# Altium footprint library Connectors.PcbLib: 408 footprints (part 3 of 26)
Each footprint in its own frame and in the unit in brackets; x right, y up, seen from the top. Pads: shape width x height; smd on the part's side, far side on the other; paste and mask are expansions set on the pad; w line width, h text height; cw(c..) or ccw(c..) is an arc to the next point about the centre after c.
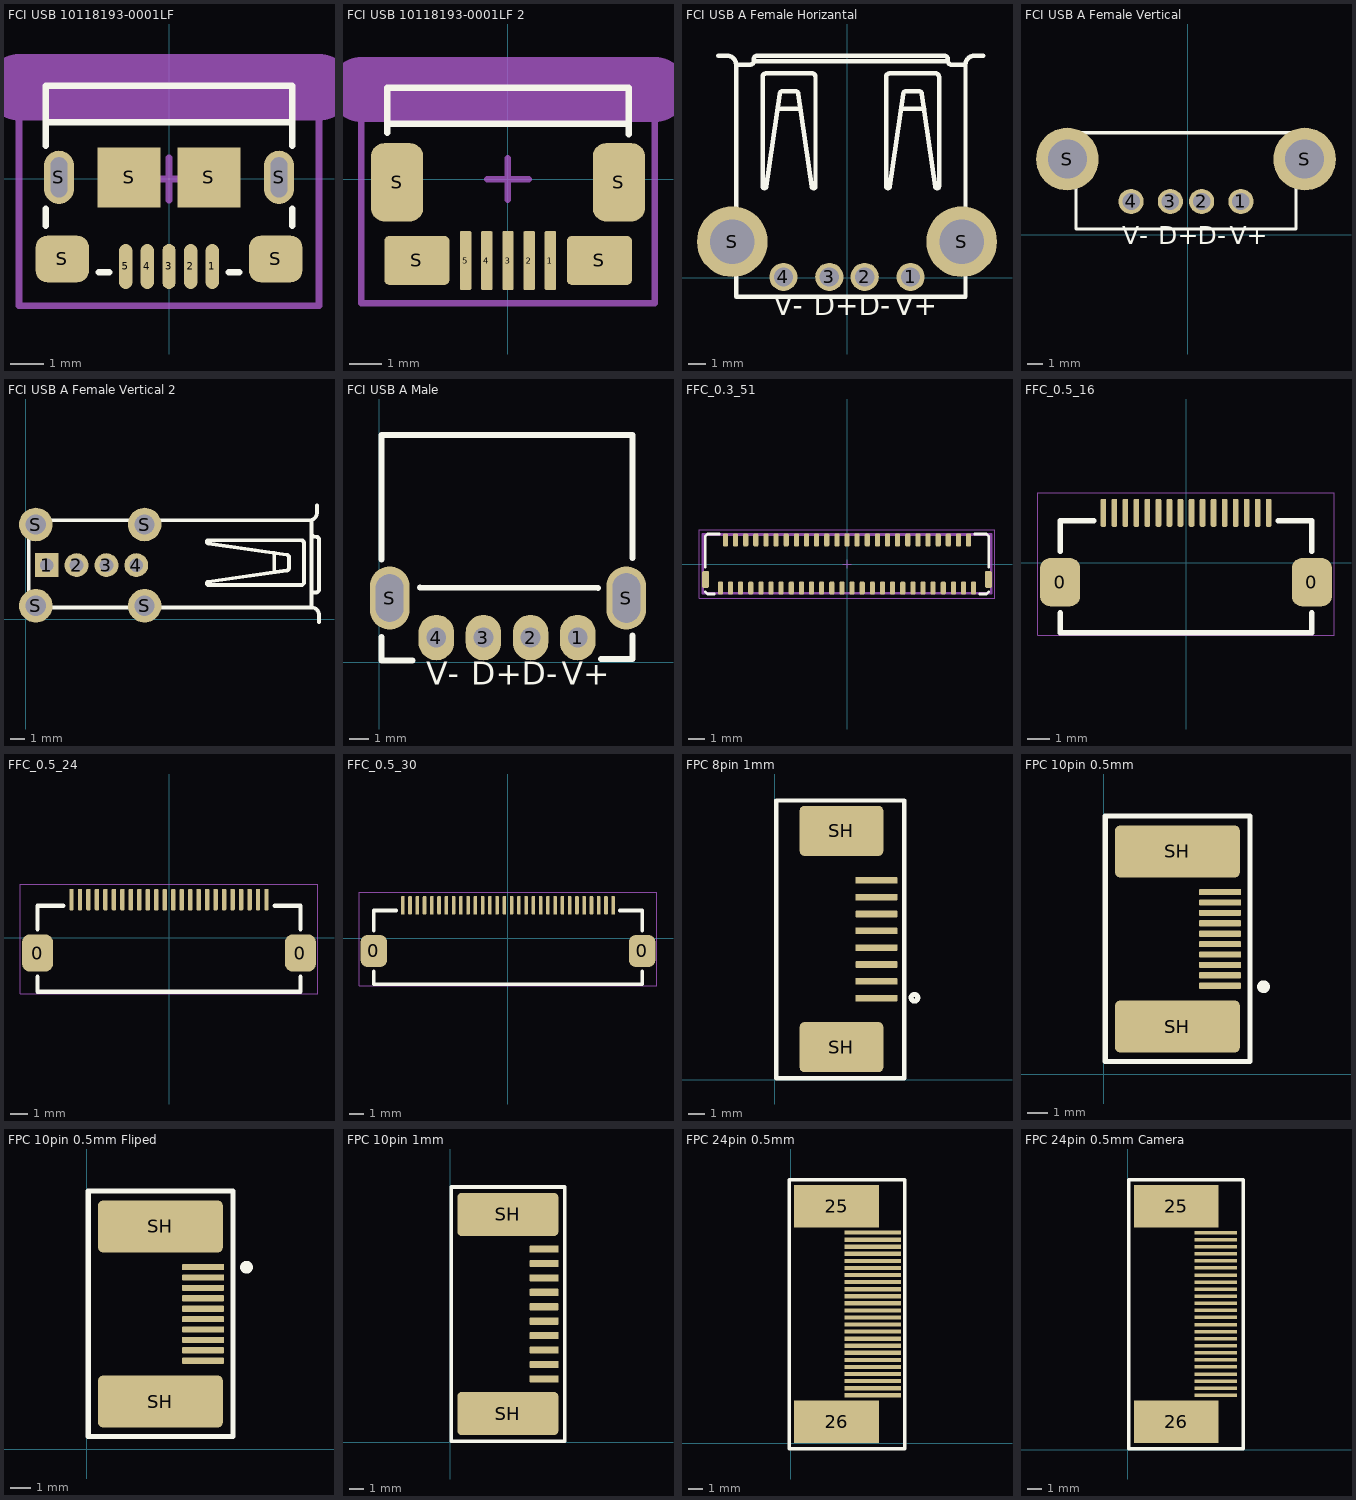
[diagram p2: the footprints below, top view; thin cyan lines are the x and y axes]

## FCI USB 10118193-0001LF [mm] "USB 2.0 Type B Micro"
height 3.1
pads (11):
  oval 0.4x1.35 smd: 1(1.3,-2.625) 2(0.65,-2.625) 3(0,-2.625) 4(-0.65,-2.625) 5(-1.3,-2.625)
  oval 0.9x1.6 hole 0.5 slot 1.2 at 90 deg: S(-3.3,0.05) S(3.3,0.05)
  rrect50% 1.6x1.4 smd: S(-3.2,-2.4) S(3.2,-2.4)
  rect 1.9x1.8 smd: S(-1.2,0.05) S(1.2,0.05)
Top Overlay:
  lines w0.2: -3.7,-1.4 -3.7,-0.9 ; -3.7,1 -3.7,1.7 ; -2.1,-2.8 -1.8,-2.8 ; 1.8,-2.8 2.1,-2.8 ; 3.7,-1.4 3.7,-0.9 ; 3.7,1 3.7,1.7 ; -3.7,1.7 3.7,1.7 ; -3.7,1.7 -3.7,2.8 3.7,2.8 3.7,1.7
Mechanical 15:
  lines w0.2: -0.635,0 0.635,0 ; 0,-0.635 0,0.635 ; -4.5,-3.8 -4.5,3.2 4.5,3.2 4.5,-3.8 -4.5,-3.8
Milling:
  lines w2: -4.5,2.754 0,2.754 4.5,2.754
3D body "FCI USB 10118193-0001lfc.STEP": height 2.78, standoff -0.82, extent -3.929,-2.9 3.928,2.76

## FCI USB 10118193-0001LF 2 [mm] "USB 2.0 Type B Micro"
height 3.1
pads (9):
  rrect20% 0.35x1.8 smd: 1(1.303,-2.494) 2(0.653,-2.494) 3(0.003,-2.494) 4(-0.647,-2.494) 5(-1.297,-2.494)
  rrect50% 1.6x2.4 smd: S(-3.397,-0.094) S(3.403,-0.094)
  rrect20% 2x1.5 smd: S(-2.79,-2.489) S(2.807,-2.489)
Top Overlay:
  lines w0.2: -3.7,1.43 -3.7,1.7 ; 3.7,1.38 3.7,1.7 ; -3.7,1.7 -3.7,2.8 3.7,2.8 3.7,1.7 ; -3.7,1.7 3.7,1.7
Mechanical 15:
  lines w0.2: -0.635,0 0.635,0 ; 0,-0.635 0,0.635 ; -4.5,-3.8 4.5,-3.8 4.5,3.2 -4.5,3.2 -4.5,-3.8
Milling:
  lines w2: -4.5,2.754 0,2.754 4.5,2.754
3D body "User Library-10104110.STEP": height 2.75, standoff -0.28, extent -4.041,-2.81 4.037,2.754

## FCI USB A Female Horizantal [mm]
pads (6):
  round 1.6 hole 1.1: 1(3.597,0.051) 2(0.997,0.051) 3(-1.003,0.051) 4(-3.603,0.051)
  round 4 hole 2.5: S(-6.503,2.051) S(6.497,2.051)
Top Overlay:
  lines w0.254: -7.288,12.589 -6.788,12.589 cw(c-6.788,12.089) -6.288,12.089 ; -3.939,9.589 -2.638,9.589 ; 3.061,9.589 4.362,9.589 ; 7.712,12.589 7.212,12.589 ccw(c7.212,12.089) 6.712,12.089 ; -6.288,-1.061 6.712,-1.061 ; -6.288,-1.061 -6.288,12.089 ; -6.288,-1.061 -6.288,-1.061 ; -6.288,12.089 -5.488,12.089 ccw(c-5.488,12.289) -5.288,12.289 ; -5.288,12.289 -5.288,12.389 cw(c-5.088,12.389) -5.088,12.589 5.512,12.589 cw(c5.512,12.389) 5.712,12.389 5.712,12.289 ; -5.288,12.289 5.712,12.289 ; 5.712,12.289 ccw(c5.912,12.289) 5.912,12.089 6.712,12.089 ; 6.712,-1.061 6.712,12.089 ; 6.712,-1.061 6.712,-1.061 ; -4.788,5.189 ccw(c-4.688,5.189) -4.688,5.089 -4.675,5.089 ccw(c-4.675,5.189) -4.576,5.175 -3.818,10.425 cw(c-3.621,10.389) -3.621,10.589 -2.955,10.589 cw(c-2.955,10.389) -2.758,10.425 -2,5.175 ccw(c-1.901,5.189) -1.901,5.089 -1.888,5.089 ccw(c-1.888,5.189) -1.788,5.189 -1.788,11.389 ccw(c-1.988,11.389) -1.988,11.589 -4.588,11.589 ccw(c-4.588,11.389) -4.788,11.389 -4.788,5.189 ; 2.212,5.189 ccw(c2.312,5.189) 2.312,5.089 2.325,5.089 ccw(c2.325,5.189) 2.424,5.175 3.182,10.425 cw(c3.379,10.389) 3.379,10.589 4.045,10.589 cw(c4.045,10.389) 4.242,10.425 5,5.175 ccw(c5.099,5.189) 5.099,5.089 5.112,5.089 ccw(c5.112,5.189) 5.212,5.189 5.212,11.389 ccw(c5.012,11.389) 5.012,11.589 2.412,11.589 ccw(c2.412,11.389) 2.212,11.389 2.212,5.189
  text "D-" at 0.664,-2.515 h2
  text "D+" at -1.876,-2.515 h2
  text "V-" at -4.162,-2.515 h2
  text "V+" at 2.696,-2.515 h2
3D body "User Library-USB-A-01.step": height 6.95, standoff -4.2, extent -7.76,-1.14 8.04,12.56

## FCI USB A Female Vertical [mm]
pads (6):
  round 1.6 hole 1.1: 1(3.39,2.143) 2(0.89,2.143) 3(-1.11,2.143) 4(-3.61,2.143)
  round 4 hole 2.5: S(-7.68,4.843) S(7.46,4.843)
Top Overlay:
  lines w0.203: -7.128,0.382 6.915,0.382 6.915,6.523 -7.128,6.523 -7.128,0.382
  text "V+" at 2.686,-0.975 h2
  text "V-" at -4.172,-0.975 h2
  text "D+" at -1.886,-0.975 h2
  text "D-" at 0.654,-0.975 h2
3D body "43749.stp": height 14.8, standoff -4, extent -7.973,-0.025 7.727,6.815

## FCI USB A Female Vertical 2 [mm]
pads (8):
  rect 1.6x1.6 hole 0.92: 1(1.396,3.637)
  round 1.6 hole 0.92: 2(3.396,3.637) 3(5.396,3.637) 4(7.396,3.637)
  round 2.25 hole 1.35: S(0.666,0.917) S(0.666,6.357) S(7.956,0.917) S(7.956,6.357)
Top Overlay:
  lines w0.254: 16.629,3.158 16.629,4.459 ; 19.13,1.68 19.13,5.74 ; 19.13,6.54 19.13,5.74 ; 19.26,5.54 19.43,5.54 cw(c19.43,5.34) 19.63,5.34 19.63,2.008 ; 19.33,5.54 cw(c19.33,5.74) 19.13,5.74 ; 19.489,7.638 19.489,7.138 cw(c18.989,7.138) 18.989,6.638 0.19,6.638 0.19,0.808 19.129,0.808 ; 19.629,-0.192 19.629,0.308 ccw(c19.129,0.308) 19.129,0.808 ; 19.629,2.008 cw(c19.429,2.008) 19.429,1.808 19.329,1.808 ccw(c19.329,1.608) 19.129,1.608 19.129,0.808 ; 12.129,2.408 ccw(c12.229,2.408) 12.229,2.308 18.429,2.308 ccw(c18.429,2.508) 18.629,2.508 18.629,5.108 ccw(c18.429,5.108) 18.429,5.308 12.229,5.308 ccw(c12.229,5.208) 12.129,5.208 12.129,5.195 ccw(c12.229,5.195) 12.215,5.096 17.465,4.338 cw(c17.429,4.141) 17.629,4.141 17.629,3.475 cw(c17.429,3.475) 17.465,3.278 12.215,2.52 ccw(c12.229,2.421) 12.129,2.421 12.129,2.408
3D body "usb_a-usb_a-e.stp": height 14.25, standoff -3.96, extent 0.2,0.08 19.4,7.278

## FCI USB A Male [mm]
pads (6):
  oval 1.8x2.3 hole 1: 1(10.03,1.25) 2(7.647,1.25) 3(5.263,1.25) 4(2.88,1.25)
  oval 2x3.2 hole 1.4 slot 2.4 at 90 deg: S(0.52,3.25)
  oval 2x3.2 hole 1.4 slot 2.5 at 90 deg: S(12.49,3.25)
Top Overlay:
  lines w0.305: 0.107,1.29 0.107,0.102 1.68,0.102 ; 0.107,5.212 0.1,11.491 3.258,11.491 12.793,11.491 12.793,5.272 ; 2.06,3.79 11.05,3.76 ; 11.22,0.162 12.793,0.162 12.793,1.35
  text "V+" at 9.226,-1.545 h2
  text "V-" at 2.368,-1.545 h2
  text "D+" at 4.654,-1.545 h2
  text "D-" at 7.194,-1.545 h2
3D body "usb_a-usb_a-lp-c.stp": height 4.5, standoff -1.3, extent 0.104,0.988 12.71,20.912

## FFC_0.3_51 [mil]
height 78.74
pads (53):
  rrect50% 16x40 smd: 0(-329.73,-36) 0(329.73,-36)
  rrect50% 12x30 smd: 1(295.27,-56) 2(283.46,56) 3(271.65,-56) 4(259.84,56) 5(248.03,-56) 6(236.22,56) 7(224.41,-56) 8(212.6,56) 9(200.79,-56) 10(188.98,56) 11(177.16,-56) 12(165.35,56) 13(153.54,-56) 14(141.73,56) 15(129.92,-56.19) 16(118.11,56) 17(106.3,-56) 18(94.49,56) 19(82.68,-56) 20(70.87,56) 21(59.05,-56) 22(47.24,56) 23(35.43,-56) 24(23.62,56) 25(11.81,-56) 26(0,56) 27(-11.81,-56) 28(-23.62,56) 29(-35.43,-56) 30(-47.24,56) 31(-59.05,-56) 32(-70.87,56) 33(-82.68,-56) 34(-94.49,56) 35(-106.3,-56) 36(-118.11,56) 37(-129.92,-56) 38(-141.73,56) 39(-153.54,-56) 40(-165.35,56) 41(-177.16,-56) 42(-188.98,56) 43(-200.79,-56) 44(-212.6,56) 45(-224.41,-56) 46(-236.22,56) 47(-248.03,-56) 48(-259.84,56) 49(-271.65,-56) 50(-283.46,56) 51(-295.27,-56)
Top Overlay:
  lines w6: -330,-65 -325,-70 -310,-70 ; -330,-7 -330,64.72 ; -330,65 -325,70 -298,70 ; 298,70 325,70 330,65 ; 310,-70 325,-70 330,-65 ; 330,-7 330,64.72
Mechanical 13:
  lines w2: -10,0 10,0 ; 0,-10 0,10
  lines w6: -336.6,-68.55 336.62,-68.55 336.62,68.85 -336.6,68.85 -336.6,-68.55
Mechanical 14:
  lines w2: -345,-80 345,-80 345,80 -345,80 -345,-80
  text ".Designator" at -31,-20 h80
3D body "10061122511420hlf.stp": height 35.43, standoff 0, extent -336.6,-68.55 336.62,68.85

## FFC_0.5_16 [mil]
height 78.74
pads (18):
  rrect50% 72x86 smd: 0(-225,-35) 0(225,-35)
  rrect50% 10x50 smd: 1(-147.64,89) 2(-127.95,89) 3(-108.27,89) 4(-88.58,89) 5(-68.9,89) 6(-49.21,89) 7(-29.53,89) 8(-9.84,89) 9(9.84,89) 10(29.53,89) 11(49.21,89) 12(68.9,89) 13(88.58,89) 14(108.27,89) 15(127.95,89) 16(147.64,89)
Top Overlay:
  lines w10: -225,-90 -225,-125 225,-125 225,-90 ; -225,20 -225,75 -165,75 ; 165,75 225,75 225,20
Mechanical 14:
  lines w2: -265,-130 -265,125 265,125 265,-130 -265,-130
  text ".Designator" at -31,-20 h80
3D body "ffc_fpc_affc20-16-050-shb-t.stp": height 81.71, standoff -1.16, extent -265.75,-130.07 265.75,80

## FFC_0.5_24 [mm]
height 2
pads (26):
  rrect50% 1.829x2.184 smd: 0(-7.747,-0.889) 0(7.747,-0.889)
  rrect50% 0.254x1.27 smd: 1(-5.75,2.26) 2(-5.25,2.26) 3(-4.75,2.26) 4(-4.25,2.26) 5(-3.75,2.26) 6(-3.25,2.26) 7(-2.75,2.26) 8(-2.25,2.26) 9(-1.75,2.26) 10(-1.25,2.26) 11(-0.75,2.26) 12(-0.25,2.26) 13(0.25,2.26) 14(0.75,2.26) 15(1.25,2.26) 16(1.75,2.26) 17(2.25,2.26) 18(2.75,2.26) 19(3.25,2.26) 20(3.75,2.26) 21(4.25,2.26) 22(4.75,2.26) 23(5.25,2.26) 24(5.75,2.26)
Top Overlay:
  lines w0.254: -7.747,-2.286 -7.747,-3.175 7.747,-3.175 7.747,-2.286 ; -7.747,0.508 -7.747,1.905 -6.223,1.905 ; 6.223,1.905 7.747,1.905 7.747,0.508
Mechanical 14:
  lines w0.051: -8.763,-3.302 -8.763,3.175 8.763,3.175 8.763,-3.302 -8.763,-3.302
  text ".Designator" at -0.787,-0.508 h2.03
3D body "ffc_fpc_affc20-24-050-shb-t.stp": height 2.08, standoff -0.03, extent -8.75,-3.294 8.75,2.042

## FFC_0.5_30 [mm]
height 2
pads (32):
  rrect50% 1.829x2.184 smd: 0(-9.247,-0.889) 0(9.247,-0.889)
  rrect50% 0.254x1.27 smd: 1(-7.25,2.26) 2(-6.75,2.26) 3(-6.25,2.26) 4(-5.75,2.26) 5(-5.25,2.26) 6(-4.75,2.26) 7(-4.25,2.26) 8(-3.75,2.26) 9(-3.25,2.26) 10(-2.75,2.26) 11(-2.25,2.26) 12(-1.75,2.26) 13(-1.25,2.26) 14(-0.75,2.26) 15(-0.25,2.26) 16(0.25,2.26) 17(0.75,2.26) 18(1.25,2.26) 19(1.75,2.26) 20(2.25,2.26) 21(2.75,2.26) 22(3.25,2.26) 23(3.75,2.26) 24(4.25,2.26) 25(4.75,2.26) 26(5.25,2.26) 27(5.75,2.26) 28(6.25,2.26) 29(6.75,2.26) 30(7.25,2.26)
Top Overlay:
  lines w0.254: -9.247,-2.286 -9.247,-3.175 9.247,-3.175 9.247,-2.286 ; -9.247,0.508 -9.247,1.905 -7.723,1.905 ; 7.723,1.905 9.247,1.905 9.247,0.508
Mechanical 14:
  lines w0.051: -10.263,-3.302 -10.263,3.175 10.263,3.175 10.263,-3.302 -10.263,-3.302
  text ".Designator" at -0.787,-0.508 h2.03

## FPC 8pin 1mm [mm] "FPC connector 8pin 1mm"
pads (10):
  rrect20% 2.5x0.4 smd: 1(6.081,4.867) 2(6.081,5.872) 3(6.081,6.876) 4(6.081,7.881) 5(6.081,8.886) 6(6.081,9.891) 7(6.081,10.895) 8(6.081,11.9)
  rrect20% 5x3 smd: SH(3.996,1.943) SH(3.996,14.851)
Top Overlay:
  lines w0.254: 0.098,0.088 0.098,16.661 7.75,16.661 7.75,0.088 0.098,0.088
  lines w0.3: 8.541,4.961 ccw(c8.355,4.887) 8.555,4.897
3D body "19r9649_84952-8.stp": height 2.54, standoff -0.02, extent 0.412,0.431 6.952,16.361

## FPC 10pin 0.5mm [mm] "FPC connector 10pin 0.5mm"
pads (12):
  rrect20% 2x0.3 smd: 1(5.581,4.258) 2(5.581,4.758) 3(5.581,5.258) 4(5.581,5.758) 5(5.581,6.258) 6(5.581,6.758) 7(5.581,7.258) 8(5.581,7.758) 9(5.581,8.258) 10(5.581,8.758)
  rrect20% 6x2.5 smd: SH(3.535,2.298) SH(3.535,10.71)
Top Overlay:
  lines w0.254: 0.065,0.624 7.022,0.624 7.022,12.411 0.065,12.411 0.065,0.624
  lines w0.3: 7.798,4.303 ccw(c7.671,4.213) 7.808,4.288
3D body "sfv10r1stae1hlf.stp": height 1.85, standoff -0.02, extent 0.586,1.241 5.486,11.741

## FPC 10pin 0.5mm Fliped [mm] "FPC connector 10pin 0.5mm"
pads (12):
  rrect20% 2x0.3 smd: 1(5.581,8.758) 2(5.581,8.258) 3(5.581,7.758) 4(5.581,7.258) 5(5.581,6.758) 6(5.581,6.258) 7(5.581,5.758) 8(5.581,5.258) 9(5.581,4.758) 10(5.581,4.258)
  rrect20% 6x2.5 smd: SH(3.535,2.298) SH(3.535,10.71)
Top Overlay:
  lines w0.254: 0.065,0.624 7.022,0.624 7.022,12.411 0.065,12.411 0.065,0.624
  lines w0.3: 7.798,8.839 ccw(c7.671,8.749) 7.808,8.824
3D body "sfv10r1stae1hlf.stp": height 1.85, standoff -0.02, extent 0.586,1.241 5.486,11.741

## FPC 10pin 1mm [mm] "FPC connector 10pin 1mm"
pads (12):
  rrect20% 2x0.5 smd: 1(6.512,4.395) 2(6.512,5.395) 3(6.512,6.395) 4(6.512,7.395) 5(6.512,8.395) 6(6.512,9.395) 7(6.512,10.395) 8(6.512,11.395) 9(6.512,12.395) 10(6.512,13.395)
  rrect20% 7x3 smd: SH(4,1.991) SH(4,15.795)
Top Overlay:
  lines w0.254: 0.062,0.076 7.953,0.076 7.953,17.7 0.062,17.7 0.062,0.076
3D body "ffc_fpc_affc20-10-100-shb-t.stp": height 2.8, standoff 0, extent 0.348,0.393 7.148,17.393

## FPC 24pin 0.5mm [mm] "FPC connector 24pin 0.5mm"
pads (26):
  rect 4x0.3 smd: 1(5.79,3.39) 2(5.79,3.89) 3(5.79,4.39) 4(5.79,4.89) 5(5.79,5.39) 6(5.79,5.89) 7(5.79,6.39) 8(5.79,6.89) 9(5.79,7.39) 10(5.79,7.89) 11(5.79,8.39) 12(5.79,8.89) 13(5.79,9.39) 14(5.79,9.89) 15(5.79,10.39) 16(5.79,10.89) 17(5.79,11.39) 18(5.79,11.89) 19(5.79,12.39) 20(5.79,12.89) 21(5.79,13.39) 22(5.79,13.89) 23(5.79,14.39) 24(5.79,14.89)
  rect 6x3 smd: 25(3.24,16.74) 26(3.24,1.53)
Top Overlay:
  lines w0.254: -0.11,-0.4 8.07,-0.4 8.07,18.62 -0.11,18.62 -0.11,-0.4
3D body "5603.stp": height 2, standoff -0.04, extent 0.13,-0.18 6.93,18.42

## FPC 24pin 0.5mm Camera [mm] "FPC connector 24pin 0.5mm"
pads (26):
  rect 3x0.25 smd: 1(6.2,3.85) 2(6.2,4.35) 3(6.2,4.85) 4(6.2,5.35) 5(6.2,5.85) 6(6.2,6.35) 7(6.2,6.85) 8(6.2,7.35) 9(6.2,7.85) 10(6.2,8.35) 11(6.2,8.85) 12(6.2,9.35) 13(6.2,9.85) 14(6.2,10.35) 15(6.2,10.85) 16(6.2,11.35) 17(6.2,11.85) 18(6.2,12.35) 19(6.2,12.85) 20(6.2,13.35) 21(6.2,13.85) 22(6.2,14.35) 23(6.2,14.85) 24(6.2,15.35)
  rect 6x3 smd: 25(3.42,17.2) 26(3.42,1.99)
Top Overlay:
  lines w0.254: 0.07,0.06 8.142,0.06 8.142,19.08 0.07,19.08 0.07,0.06
3D body "5603.stp": height 2, standoff -0.04, extent 0.31,0.28 7.11,18.88
3D body "User Library-ov9655.STEP": height 5.85, standoff -0.18, extent -17.35,3.39 4.15,15.89